# Altium footprint library NXP_60_26022015.PCBLIB: 287 footprints (part 8 of 18)
Each footprint in its own frame and in the unit in brackets; x right, y up, seen from the top. Pads: shape width x height; smd on the part's side, far side on the other; paste and mask are expansions set on the pad; w line width, h text height; cw(c..) or ccw(c..) is an arc to the next point about the centre after c.
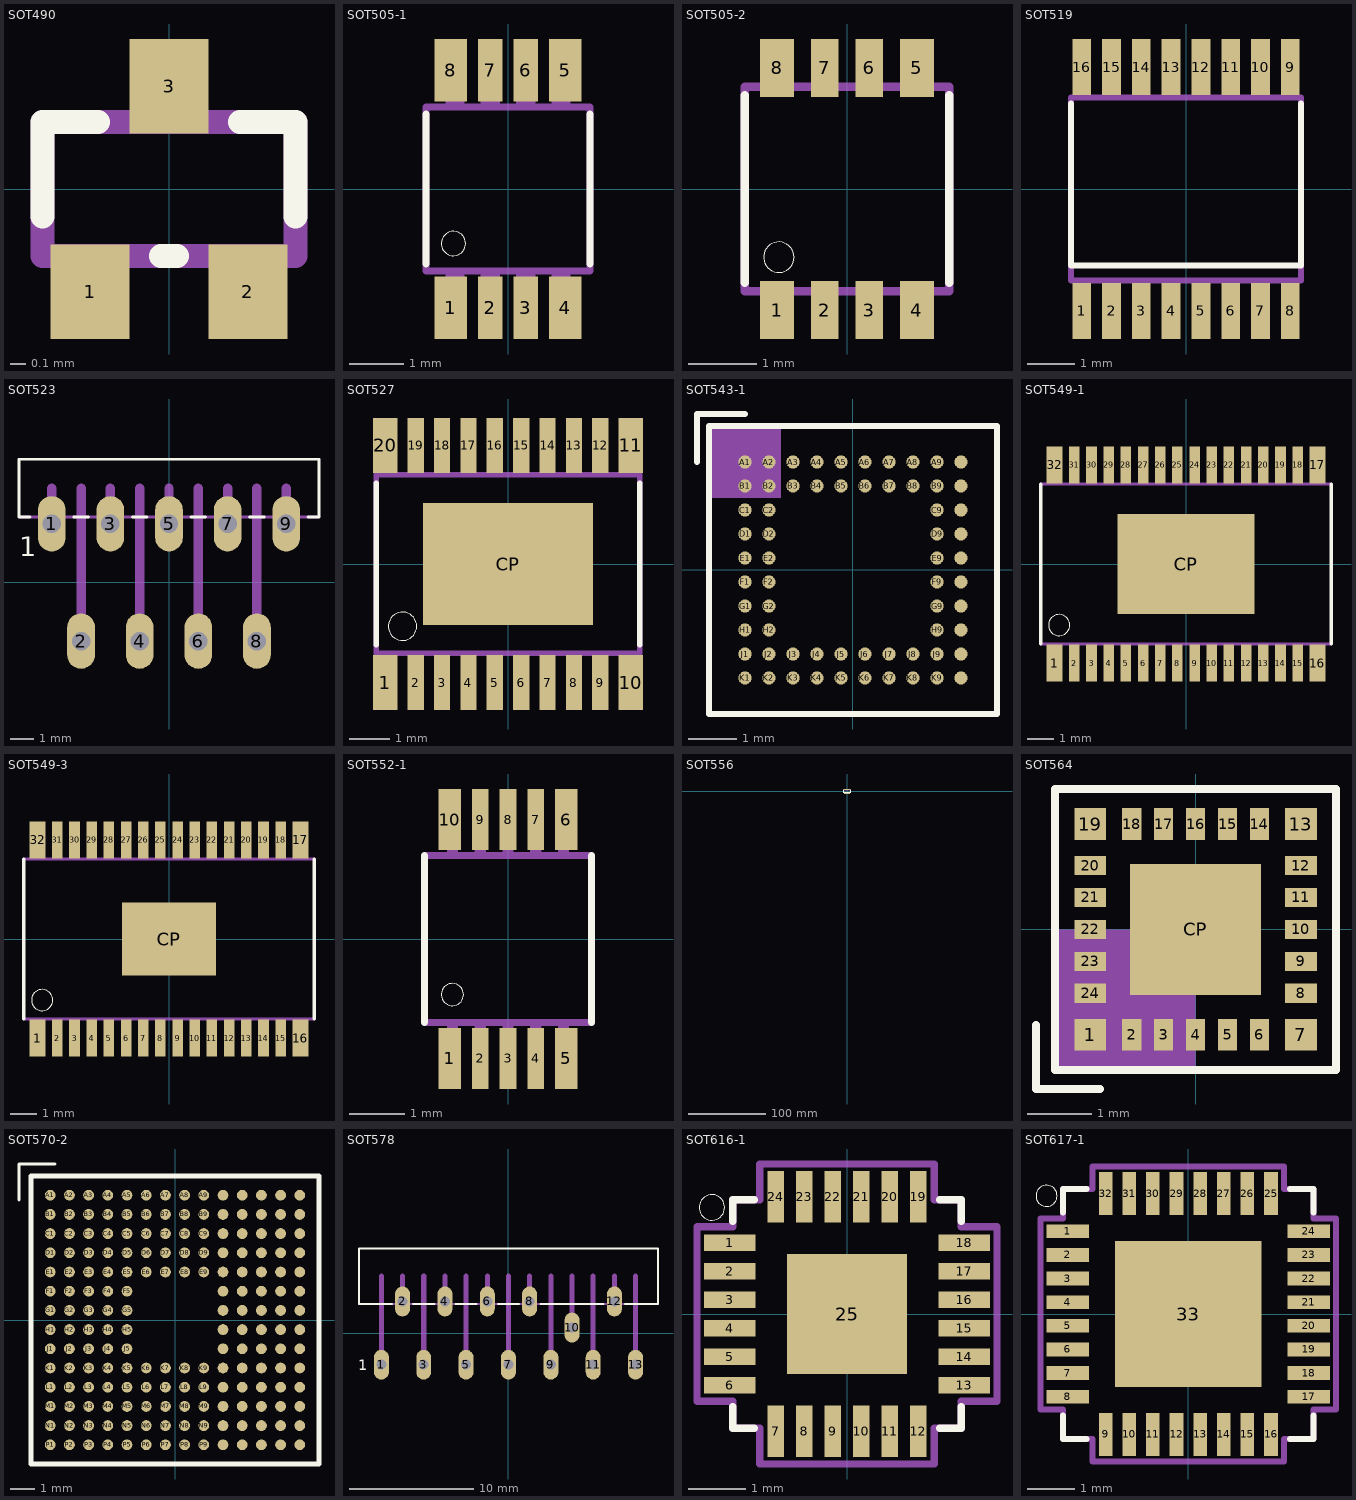
[diagram p7: the footprints below, top view; thin cyan lines are the x and y axes]

## SOT490 [mm]
pads (3):
  rect 0.5x0.6 smd: 1(-0.5,-0.65) 2(0.5,-0.65) 3(0,0.65)
Top Overlay:
  lines w0.152: -0.8,-0.175 -0.8,0.425 -0.45,0.425 ; -0.05,-0.425 0.05,-0.425 ; 0.45,0.425 0.8,0.425 0.8,-0.175
Mechanical 16:
  rectangle: -0.14,0.425 0.14,0.825
  rectangle: -0.64,-0.825 -0.36,-0.425
  rectangle: 0.36,-0.825 0.64,-0.425
  lines w0.152: -0.8,-0.425 0.8,-0.425 0.8,0.425 -0.8,0.425 -0.8,-0.425

## SOT505-1 [mm]
pads (8):
  rect 0.6x1.15 smd: 1(-1.05,-2.175) 4(1.05,-2.175) 5(1.05,2.175) 8(-1.05,2.175)
  rect 0.45x1.15 smd: 2(-0.325,-2.175) 3(0.325,-2.175) 6(0.325,2.175) 7(-0.325,2.175)
Top Overlay:
  circle w0: c-1,-1 r0.224
  lines w0.127: -1.5,-1.375 -1.5,1.375 ; 1.5,-1.375 1.5,1.375
Mechanical 16:
  rectangle: -1.15,1.5 -0.8,2.4
  rectangle: -0.5,1.5 -0.15,2.4
  rectangle: 0.15,1.5 0.5,2.4
  rectangle: 0.8,1.5 1.15,2.4
  rectangle: -1.15,-2.4 -0.8,-1.5
  rectangle: -0.5,-2.4 -0.15,-1.5
  rectangle: 0.15,-2.4 0.5,-1.5
  rectangle: 0.8,-2.4 1.15,-1.5
  lines w0.127: -1.5,-1.5 1.5,-1.5 1.5,1.5 -1.5,1.5 -1.5,-1.5

## SOT505-2 [mm]
pads (8):
  rect 0.5x0.85 smd: 1(-1.025,-1.775) 4(1.025,-1.775) 5(1.025,1.775) 8(-1.025,1.775)
  rect 0.4x0.85 smd: 2(-0.325,-1.775) 3(0.325,-1.775) 6(0.325,1.775) 7(-0.325,1.775)
Top Overlay:
  circle w0: c-1,-1 r0.224
  lines w0.127: -1.5,-1.375 -1.5,1.375 ; 1.5,-1.375 1.5,1.375
Mechanical 16:
  rectangle: -1.15,1.5 -0.8,2
  rectangle: -0.5,1.5 -0.15,2
  rectangle: 0.15,1.5 0.5,2
  rectangle: 0.8,1.5 1.15,2
  rectangle: -1.15,-2 -0.8,-1.5
  rectangle: -0.5,-2 -0.15,-1.5
  rectangle: 0.15,-2 0.5,-1.5
  rectangle: 0.8,-2 1.15,-1.5
  lines w0.127: -1.5,-1.5 1.5,-1.5 1.5,1.5 -1.5,1.5 -1.5,-1.5

## SOT519 [mil]
pads (16):
  rect 15.75x47.24 smd: 1(-87.5,-102.36) 2(-62.5,-102.36) 3(-37.5,-102.36) 4(-12.5,-102.36) 5(12.5,-102.36) 6(37.5,-102.36) 7(62.5,-102.36) 8(87.5,-102.36) 9(87.5,102.36) 10(62.5,102.36) 11(37.5,102.36) 12(12.5,102.36) 13(-12.5,102.36) 14(-37.5,102.36) 15(-62.5,102.36) 16(-87.5,102.36)
Top Overlay:
  lines w5: -96.46,71.85 -96.46,-64.27 96.46,-64.27 96.46,71.85
Mechanical 16:
  rectangle: -93.5,-114.17 -81.69,-74.8
  region: -81.5,114.17 -93.31,114.17 -93.31,74.8 -81.5,74.8
  region: -56.5,114.17 -68.31,114.17 -68.31,74.8 -56.5,74.8
  region: -31.5,114.17 -43.31,114.17 -43.31,74.8 -31.5,74.8
  region: -6.5,114.17 -18.31,114.17 -18.31,74.8 -6.5,74.8
  region: 18.5,114.17 6.69,114.17 6.69,74.8 18.5,74.8
  region: 43.5,114.17 31.69,114.17 31.69,74.8 43.5,74.8
  region: 68.5,114.17 56.69,114.17 56.69,74.8 68.5,74.8
  region: 93.5,114.17 81.69,114.17 81.69,74.8 93.5,74.8
  rectangle: -68.5,-114.17 -56.69,-74.8
  rectangle: -43.5,-114.17 -31.69,-74.8
  rectangle: -18.5,-114.17 -6.69,-74.8
  rectangle: 6.5,-114.17 18.31,-74.8
  rectangle: 31.5,-114.17 43.31,-74.8
  rectangle: 56.5,-114.17 68.31,-74.8
  rectangle: 81.5,-114.17 93.31,-74.8
  lines w5: -96.46,-76.77 96.46,-76.77 96.46,76.77 -96.46,76.77 -96.46,-76.77

## SOT523 [mil]
pads (9):
  oval 47.25x94.5 hole 31.5: 1(-200,100) 2(-150,-100) 3(-100,100) 4(-50,-100) 5(0,100) 6(50,-100) 7(100,100) 8(150,-100) 9(200,100)
Top Overlay:
  lines w5: -237.5,111.81 -255.91,111.81 -255.91,210.24 255.91,210.24 255.91,111.81 237.5,111.81 ; -162.5,111.81 -137.5,111.81 ; -62.5,111.81 -37.5,111.81 ; 37.5,111.81 62.5,111.81 ; 137.5,111.81 162.5,111.81
  text "1" at -255.32,44.69 h33.46
Mechanical 16:
  lines w5: -255.91,111.81 255.91,111.81
  lines w16: -200,100 -200,161.02 ; -150,-100 -150,161.02 ; -100,100 -100,161.02 ; -50,-100 -50,161.02 ; 0,100 0,161.02 ; 50,-100 50,161.02 ; 100,100 100,161.02 ; 150,-100 150,161.02 ; 200,100 200,161.02

## SOT527 [mm]
pads (21):
  rect 0.6x1.35 smd: 1(-3.025,-2.925) 10(3.025,-2.925) 11(3.025,2.925) 20(-3.025,2.925)
  rect 0.4x1.35 smd: 2(-2.275,-2.925) 3(-1.625,-2.925) 4(-0.975,-2.925) 5(-0.325,-2.925) 6(0.325,-2.925) 7(0.975,-2.925) 8(1.625,-2.925) 9(2.275,-2.925) 12(2.275,2.925) 13(1.625,2.925) 14(0.975,2.925) 15(0.325,2.925) 16(-0.325,2.925) 17(-0.975,2.925) 18(-1.625,2.925) 19(-2.275,2.925)
  rect 4.2x3 smd: CP(0,0)
Top Overlay:
  circle w0: c-2.6,-1.535 r0.35
  lines w0.127: -3.25,-2 -3.25,2 ; 3.25,-2 3.25,2
Top Paste:
  rectangle: -1.3,0.325 -0.325,1.3
  rectangle: 0.325,0.325 1.3,1.3
  rectangle: -1.3,-1.3 -0.325,-0.325
  rectangle: 0.325,-1.3 1.3,-0.325
Mechanical 16:
  rectangle: 0.2,2.2 0.45,3.2
  rectangle: -0.45,2.2 -0.2,3.2
  rectangle: -1.1,2.2 -0.85,3.2
  rectangle: -1.75,2.2 -1.5,3.2
  rectangle: -2.4,2.2 -2.15,3.2
  rectangle: -3.05,2.2 -2.8,3.2
  rectangle: 0.85,2.2 1.1,3.2
  rectangle: 1.5,2.2 1.75,3.2
  rectangle: 2.15,2.2 2.4,3.2
  rectangle: 2.8,2.2 3.05,3.2
  rectangle: -3.05,-3.2 -2.8,-2.2
  rectangle: -2.4,-3.2 -2.15,-2.2
  rectangle: -1.75,-3.2 -1.5,-2.2
  rectangle: -1.1,-3.2 -0.85,-2.2
  rectangle: -0.45,-3.2 -0.2,-2.2
  rectangle: 0.2,-3.2 0.45,-2.2
  rectangle: 0.85,-3.2 1.1,-2.2
  rectangle: 1.5,-3.2 1.75,-2.2
  rectangle: 2.15,-3.2 2.4,-2.2
  rectangle: 2.8,-3.2 3.05,-2.2
  lines w0.127: -3.25,-2.2 3.25,-2.2 3.25,2.2 -3.25,2.2 -3.25,-2.2

## SOT543-1 [mm]
pads (64):
  rrect100% 0.275x0.275 smd: A1(-2.25,2.25) A2(-1.75,2.25) A3(-1.25,2.25) A4(-0.75,2.25) A5(-0.25,2.25) A6(0.25,2.25) A7(0.75,2.25) A8(1.25,2.25) A9(1.75,2.25) A10(2.25,2.25) B1(-2.25,1.75) B2(-1.75,1.75) B3(-1.25,1.75) B4(-0.75,1.75) B5(-0.25,1.75) B6(0.25,1.75) B7(0.75,1.75) B8(1.25,1.75) B9(1.75,1.75) B10(2.25,1.75) C1(-2.25,1.25) C2(-1.75,1.25) C9(1.75,1.25) C10(2.25,1.25) D1(-2.25,0.75) D2(-1.75,0.75) D9(1.75,0.75) D10(2.25,0.75) E1(-2.25,0.25) E2(-1.75,0.25) E9(1.75,0.25) E10(2.25,0.25) F1(-2.25,-0.25) F2(-1.75,-0.25) F9(1.75,-0.25) F10(2.25,-0.25) G1(-2.25,-0.75) G2(-1.75,-0.75) G9(1.75,-0.75) G10(2.25,-0.75) H1(-2.25,-1.25) H2(-1.75,-1.25) H9(1.75,-1.25) H10(2.25,-1.25) J1(-2.25,-1.75) J2(-1.75,-1.75) J3(-1.25,-1.75) J4(-0.75,-1.75) J5(-0.25,-1.75) J6(0.25,-1.75) J7(0.75,-1.75) J8(1.25,-1.75) J9(1.75,-1.75) J10(2.25,-1.75) K1(-2.25,-2.25) K2(-1.75,-2.25) K3(-1.25,-2.25) K4(-0.75,-2.25) K5(-0.25,-2.25) K6(0.25,-2.25) K7(0.75,-2.25) K8(1.25,-2.25) K9(1.75,-2.25) K10(2.25,-2.25)
Top Overlay:
  lines w0.127: -3.25,2.25 -3.25,3.25 -2.25,3.25 ; -3,-3 -3,3 3,3 3,-3 -3,-3
Mechanical 16:
  region: -3,2.95 -3,1.5 -1.5,1.5 -1.5,2.95

## SOT549-1 [mm]
pads (33):
  rect 0.6x1.4 smd: 1(-4.975,-3.75) 16(4.975,-3.75) 17(4.975,3.75) 32(-4.975,3.75)
  rect 0.4x1.4 smd: 2(-4.225,-3.75) 3(-3.575,-3.75) 4(-2.925,-3.75) 5(-2.275,-3.75) 6(-1.625,-3.75) 7(-0.975,-3.75) 8(-0.325,-3.75) 9(0.325,-3.75) 10(0.975,-3.75) 11(1.625,-3.75) 12(2.275,-3.75) 13(2.925,-3.75) 14(3.575,-3.75) 15(4.225,-3.75) 18(4.225,3.75) 19(3.575,3.75) 20(2.925,3.75) 21(2.275,3.75) 22(1.625,3.75) 23(0.975,3.75) 24(0.325,3.75) 25(-0.325,3.75) 26(-0.975,3.75) 27(-1.625,3.75) 28(-2.275,3.75) 29(-2.925,3.75) 30(-3.575,3.75) 31(-4.225,3.75)
  rect 5.2x3.8 smd: CP(0,0)
Top Overlay:
  circle w0: c-4.8,-2.31 r0.4
  lines w0.127: -5.5,-3.025 -5.5,3.025 ; 5.5,-3.025 5.5,3.025
Top Paste:
  rectangle: 0.183,-0.4 1.183,0.4
  rectangle: 1.549,-0.4 2.549,0.4
  rectangle: -1.183,-0.4 -0.183,0.4
  rectangle: -2.549,-0.4 -1.549,0.4
  rectangle: 1.549,1.05 2.549,1.85
  rectangle: 0.183,1.05 1.183,1.85
  rectangle: -1.183,1.05 -0.183,1.85
  rectangle: -2.549,1.05 -1.549,1.85
  rectangle: -2.549,-1.85 -1.549,-1.05
  rectangle: -1.183,-1.85 -0.183,-1.05
  rectangle: 0.183,-1.85 1.183,-1.05
  rectangle: 1.549,-1.85 2.549,-1.05
Mechanical 16:
  rectangle: -1.1,3.025 -0.85,4.025
  rectangle: -1.75,3.025 -1.5,4.025
  rectangle: -2.4,3.025 -2.15,4.025
  rectangle: -3.05,3.025 -2.8,4.025
  rectangle: -3.7,3.025 -3.45,4.025
  rectangle: -4.35,3.025 -4.1,4.025
  rectangle: -5,3.025 -4.75,4.025
  rectangle: -0.45,3.025 -0.2,4.025
  rectangle: 0.2,3.025 0.45,4.025
  rectangle: 0.85,3.025 1.1,4.025
  rectangle: 1.5,3.025 1.75,4.025
  rectangle: 2.15,3.025 2.4,4.025
  rectangle: 4.1,3.025 4.35,4.025
  rectangle: 4.75,3.025 5,4.025
  rectangle: -1.1,-4.025 -0.85,-3.025
  rectangle: -1.75,-4.025 -1.5,-3.025
  rectangle: -2.4,-4.025 -2.15,-3.025
  rectangle: -3.05,-4.025 -2.8,-3.025
  rectangle: -3.7,-4.025 -3.45,-3.025
  rectangle: -4.35,-4.025 -4.1,-3.025
  rectangle: -5,-4.025 -4.75,-3.025
  rectangle: -0.45,-4.025 -0.2,-3.025
  rectangle: 0.2,-4.025 0.45,-3.025
  rectangle: 0.85,-4.025 1.1,-3.025
  rectangle: 1.5,-4.025 1.75,-3.025
  rectangle: 2.15,-4.025 2.4,-3.025
  rectangle: 4.1,-4.025 4.35,-3.025
  rectangle: 4.75,-4.025 5,-3.025
  rectangle: 2.8,3.025 3.05,4.025
  rectangle: 3.45,3.025 3.7,4.025
  rectangle: 2.8,-4.025 3.05,-3.025
  rectangle: 3.45,-4.025 3.7,-3.025
  lines w0.127: -5.5,-3.025 5.5,-3.025 ; -5.5,3.025 5.5,3.025

## SOT549-3 [mm]
pads (33):
  rect 0.6x1.4 smd: 1(-4.975,-3.75) 16(4.975,-3.75) 17(4.975,3.75) 32(-4.975,3.75)
  rect 0.4x1.4 smd: 2(-4.225,-3.75) 3(-3.575,-3.75) 4(-2.925,-3.75) 5(-2.275,-3.75) 6(-1.625,-3.75) 7(-0.975,-3.75) 8(-0.325,-3.75) 9(0.325,-3.75) 10(0.975,-3.75) 11(1.625,-3.75) 12(2.275,-3.75) 13(2.925,-3.75) 14(3.575,-3.75) 15(4.225,-3.75) 18(4.225,3.75) 19(3.575,3.75) 20(2.925,3.75) 21(2.275,3.75) 22(1.625,3.75) 23(0.975,3.75) 24(0.325,3.75) 25(-0.325,3.75) 26(-0.975,3.75) 27(-1.625,3.75) 28(-2.275,3.75) 29(-2.925,3.75) 30(-3.575,3.75) 31(-4.225,3.75)
  rect 3.55x2.75 smd: CP(0,0)
Top Overlay:
  circle w0: c-4.8,-2.31 r0.4
  lines w0.127: -5.5,-3.025 -5.5,3.025 ; 5.5,-3.025 5.5,3.025
Top Paste:
  rectangle: 0.163,0.163 0.975,0.975
  rectangle: 0.163,-0.975 0.975,-0.163
  rectangle: -0.975,-0.975 -0.163,-0.163
  rectangle: -0.975,0.163 -0.163,0.975
Mechanical 16:
  rectangle: -1.1,3.025 -0.85,4.025
  rectangle: -1.75,3.025 -1.5,4.025
  rectangle: -2.4,3.025 -2.15,4.025
  rectangle: -3.05,3.025 -2.8,4.025
  rectangle: -3.7,3.025 -3.45,4.025
  rectangle: -4.35,3.025 -4.1,4.025
  rectangle: -5,3.025 -4.75,4.025
  rectangle: -0.45,3.025 -0.2,4.025
  rectangle: 0.2,3.025 0.45,4.025
  rectangle: 0.85,3.025 1.1,4.025
  rectangle: 1.5,3.025 1.75,4.025
  rectangle: 2.15,3.025 2.4,4.025
  rectangle: 4.1,3.025 4.35,4.025
  rectangle: 4.75,3.025 5,4.025
  rectangle: -1.1,-4.025 -0.85,-3.025
  rectangle: -1.75,-4.025 -1.5,-3.025
  rectangle: -2.4,-4.025 -2.15,-3.025
  rectangle: -3.05,-4.025 -2.8,-3.025
  rectangle: -3.7,-4.025 -3.45,-3.025
  rectangle: -4.35,-4.025 -4.1,-3.025
  rectangle: -5,-4.025 -4.75,-3.025
  rectangle: -0.45,-4.025 -0.2,-3.025
  rectangle: 0.2,-4.025 0.45,-3.025
  rectangle: 0.85,-4.025 1.1,-3.025
  rectangle: 1.5,-4.025 1.75,-3.025
  rectangle: 2.15,-4.025 2.4,-3.025
  rectangle: 4.1,-4.025 4.35,-3.025
  rectangle: 4.75,-4.025 5,-3.025
  rectangle: 2.8,3.025 3.05,4.025
  rectangle: 3.45,3.025 3.7,4.025
  rectangle: 2.8,-4.025 3.05,-3.025
  rectangle: 3.45,-4.025 3.7,-3.025
  lines w0.127: -5.5,-3.025 5.5,-3.025 ; -5.5,3.025 5.5,3.025

## SOT552-1 [mm]
pads (10):
  rect 0.4x1.1 smd: 1(-1.05,-2.15) 5(1.05,-2.15) 6(1.05,2.15) 10(-1.05,2.15)
  rect 0.3x1.1 smd: 2(-0.5,-2.15) 3(0,-2.15) 4(0.5,-2.15) 7(0.5,2.15) 8(0,2.15) 9(-0.5,2.15)
Top Overlay:
  circle w0: c-1,-1 r0.2
  lines w0.127: -1.5,-1.5 -1.5,1.5 ; 1.5,-1.5 1.5,1.5
Mechanical 16:
  rectangle: -0.1,1.5 0.1,2.45
  rectangle: -0.6,1.5 -0.4,2.45
  rectangle: -1.1,1.5 -0.9,2.45
  rectangle: 0.4,1.5 0.6,2.45
  rectangle: 0.9,1.5 1.1,2.45
  rectangle: -1.1,-2.45 -0.9,-1.5
  rectangle: -0.6,-2.45 -0.4,-1.5
  rectangle: -0.1,-2.45 0.1,-1.5
  rectangle: 0.4,-2.45 0.6,-1.5
  rectangle: 0.9,-2.45 1.1,-1.5
  lines w0.127: -1.5,-1.5 1.5,-1.5 ; -1.5,1.5 1.5,1.5

## SOT556 [mil]
pads (24):
  rect 15.75x47.24 smd: 1(-137.5,-102.36) 2(-112.5,-102.36) 3(-87.5,-102.36) 4(-62.5,-102.36) 5(-37.5,-102.36) 6(-12.5,-102.36) 7(12.5,-102.36) 8(37.5,-102.36) 9(62.5,-102.36) 10(87.5,-102.36) 11(112.5,-102.36) 12(137.5,-102.36) 13(137.5,102.36) 14(112.5,102.36) 15(87.5,102.36) 16(62.5,102.36) 17(37.5,102.36) 18(12.5,102.36) 19(-12.5,102.36) 20(-37.5,102.36) 21(-62.5,102.36) 22(-87.5,102.36) 23(-112.5,102.36) 24(-137.5,102.36)
Top Overlay:
  lines w5: -171.26,-76.77 -171.26,-64.27 ; -171.26,76.77 -171.26,-64.27 ; 171.26,-76.77 171.26,-64.27 ; 171.26,76.77 171.26,-64.27 ; -171.26,-64.27 cw(c0,-7635.39) 171.26,-64.27
Mechanical 16:
  rectangle: -143.5,-114.17 -131.69,-74.8
  region: -131.5,114.17 -143.31,114.17 -143.31,74.8 -131.5,74.8
  region: -106.5,114.17 -118.31,114.17 -118.31,74.8 -106.5,74.8
  region: -81.5,114.17 -93.31,114.17 -93.31,74.8 -81.5,74.8
  region: -56.5,114.17 -68.31,114.17 -68.31,74.8 -56.5,74.8
  region: -31.5,114.17 -43.31,114.17 -43.31,74.8 -31.5,74.8
  region: -6.5,114.17 -18.31,114.17 -18.31,74.8 -6.5,74.8
  region: 18.5,114.17 6.69,114.17 6.69,74.8 18.5,74.8
  region: 43.5,114.17 31.69,114.17 31.69,74.8 43.5,74.8
  rectangle: -118.5,-114.17 -106.69,-74.8
  rectangle: -93.5,-114.17 -81.69,-74.8
  rectangle: -68.5,-114.17 -56.69,-74.8
  rectangle: -43.5,-114.17 -31.69,-74.8
  rectangle: -18.5,-114.17 -6.69,-74.8
  rectangle: 6.5,-114.17 18.31,-74.8
  rectangle: 31.5,-114.17 43.31,-74.8
  region: 68.5,114.17 56.69,114.17 56.69,74.8 68.5,74.8
  region: 93.5,114.17 81.69,114.17 81.69,74.8 93.5,74.8
  region: 118.5,114.17 106.69,114.17 106.69,74.8 118.5,74.8
  region: 143.5,114.17 131.69,114.17 131.69,74.8 143.5,74.8
  rectangle: 56.5,-114.17 68.31,-74.8
  rectangle: 81.5,-114.17 93.31,-74.8
  rectangle: 106.5,-114.17 118.31,-74.8
  rectangle: 131.5,-114.17 143.31,-74.8
  lines w5: -171.26,-76.77 171.26,-76.77 ; -171.26,76.77 171.26,76.77

## SOT564 [mm]
pads (25):
  rect 0.5x0.5 smd: 1(-1.65,-1.65) 7(1.65,-1.65) 13(1.65,1.65) 19(-1.65,1.65)
  rect 0.3x0.5 smd: 2(-1,-1.65) 3(-0.5,-1.65) 4(0,-1.65) 5(0.5,-1.65) 6(1,-1.65) 14(1,1.65) 15(0.5,1.65) 16(0,1.65) 17(-0.5,1.65) 18(-1,1.65)
  rect 0.5x0.3 smd: 8(1.65,-1) 9(1.65,-0.5) 10(1.65,0) 11(1.65,0.5) 12(1.65,1) 20(-1.65,1) 21(-1.65,0.5) 22(-1.65,0) 23(-1.65,-0.5) 24(-1.65,-1)
  rect 2.05x2.05 smd: CP(0,0)
Top Overlay:
  lines w0.127: -2.5,-1.5 -2.5,-2.5 -1.5,-2.5 ; -2.2,-2.2 2.2,-2.2 2.2,2.2 -2.2,2.2 -2.2,-2.2
Top Paste:
  rectangle: -0.2,-0.2 0.2,0.2
  rectangle: 0.437,-0.2 0.837,0.2
  rectangle: -0.837,-0.2 -0.437,0.2
  rectangle: -0.2,0.437 0.2,0.837
  rectangle: -0.837,0.437 -0.437,0.837
  rectangle: 0.437,0.437 0.837,0.837
  rectangle: -0.2,-0.837 0.2,-0.437
  rectangle: 0.437,-0.837 0.837,-0.437
  rectangle: -0.837,-0.837 -0.437,-0.437
  rectangle: 1.425,-0.15 1.9,0.15
  rectangle: 1.425,0.35 1.9,0.65
  rectangle: 1.425,0.85 1.9,1.15
  rectangle: 1.425,-0.65 1.9,-0.35
  rectangle: 1.425,-1.15 1.9,-0.85
  rectangle: -1.9,-0.15 -1.425,0.15
  rectangle: -1.9,0.35 -1.425,0.65
  rectangle: -1.9,0.85 -1.425,1.15
  rectangle: -1.9,-0.65 -1.425,-0.35
  rectangle: -1.9,-1.15 -1.425,-0.85
  rectangle: -0.15,1.425 0.15,1.9
  rectangle: -0.65,1.425 -0.35,1.9
  rectangle: -1.15,1.425 -0.85,1.9
  rectangle: 0.35,1.425 0.65,1.9
  rectangle: 0.85,1.425 1.15,1.9
  rectangle: -0.15,-1.9 0.15,-1.425
  rectangle: -0.65,-1.9 -0.35,-1.425
  rectangle: -1.15,-1.9 -0.85,-1.425
  rectangle: 0.35,-1.9 0.65,-1.425
  rectangle: 0.85,-1.9 1.15,-1.425
  rectangle: 1.425,1.425 1.9,1.9
  rectangle: -1.9,-1.9 -1.425,-1.425
  rectangle: -1.9,1.425 -1.425,1.9
  rectangle: 1.425,-1.9 1.9,-1.425
Mechanical 16:
  rectangle: -2.2,-2.2 0,0

## SOT570-2 [mm]
pads (180):
  rrect100% 0.45x0.45 smd: A1(-5.2,5.2) A2(-4.4,5.2) A3(-3.6,5.2) A4(-2.8,5.2) A5(-2,5.2) A6(-1.2,5.2) A7(-0.4,5.2) A8(0.4,5.2) A9(1.2,5.2) A10(2,5.2) A11(2.8,5.2) A12(3.6,5.2) A13(4.4,5.2) A14(5.2,5.2) B1(-5.2,4.4) B2(-4.4,4.4) B3(-3.6,4.4) B4(-2.8,4.4) B5(-2,4.4) B6(-1.2,4.4) B7(-0.4,4.4) B8(0.4,4.4) B9(1.2,4.4) B10(2,4.4) B11(2.8,4.4) B12(3.6,4.4) B13(4.4,4.4) B14(5.2,4.4) C1(-5.2,3.6) C2(-4.4,3.6) C3(-3.6,3.6) C4(-2.8,3.6) C5(-2,3.6) C6(-1.2,3.6) C7(-0.4,3.6) C8(0.4,3.6) C9(1.2,3.6) C10(2,3.6) C11(2.8,3.6) C12(3.6,3.6) C13(4.4,3.6) C14(5.2,3.6) D1(-5.2,2.8) D2(-4.4,2.8) D3(-3.6,2.8) D4(-2.8,2.8) D5(-2,2.8) D6(-1.2,2.8) D7(-0.4,2.8) D8(0.4,2.8) D9(1.2,2.8) D10(2,2.8) D11(2.8,2.8) D12(3.6,2.8) D13(4.4,2.8) D14(5.2,2.8) E1(-5.2,2) E2(-4.4,2) E3(-3.6,2) E4(-2.8,2) E5(-2,2) E6(-1.2,2) E7(-0.4,2) E8(0.4,2) E9(1.2,2) E10(2,2) E11(2.8,2) E12(3.6,2) E13(4.4,2) E14(5.2,2) F1(-5.2,1.2) F2(-4.4,1.2) F3(-3.6,1.2) F4(-2.8,1.2) F5(-2,1.2) F10(2,1.2) F11(2.8,1.2) F12(3.6,1.2) F13(4.4,1.2) F14(5.2,1.2) G1(-5.2,0.4) G2(-4.4,0.4) G3(-3.6,0.4) G4(-2.8,0.4) G5(-2,0.4) G10(2,0.4) G11(2.8,0.4) G12(3.6,0.4) G13(4.4,0.4) G14(5.2,0.4) H1(-5.2,-0.4) H2(-4.4,-0.4) H3(-3.6,-0.4) H4(-2.8,-0.4) H5(-2,-0.4) H10(2,-0.4) H11(2.8,-0.4) H12(3.6,-0.4) H13(4.4,-0.4) H14(5.2,-0.4) J1(-5.2,-1.2) J2(-4.4,-1.2) J3(-3.6,-1.2) J4(-2.8,-1.2) J5(-2,-1.2) J10(2,-1.2) J11(2.8,-1.2) J12(3.6,-1.2) J13(4.4,-1.2) J14(5.2,-1.2) K1(-5.2,-2) K2(-4.4,-2) K3(-3.6,-2) K4(-2.8,-2) K5(-2,-2) K6(-1.2,-2) K7(-0.4,-2) K8(0.4,-2) K9(1.2,-2) K10(2,-2) K11(2.8,-2) K12(3.6,-2) K13(4.4,-2) K14(5.2,-2) L1(-5.2,-2.8) L2(-4.4,-2.8) L3(-3.6,-2.8) L4(-2.8,-2.8) L5(-2,-2.8) L6(-1.2,-2.8) L7(-0.4,-2.8) L8(0.4,-2.8) L9(1.2,-2.8) L10(2,-2.8) L11(2.8,-2.8) L12(3.6,-2.8) L13(4.4,-2.8) L14(5.2,-2.8) M1(-5.2,-3.6) M2(-4.4,-3.6) M3(-3.6,-3.6) M4(-2.8,-3.6) M5(-2,-3.6) M6(-1.2,-3.6) M7(-0.4,-3.6) M8(0.4,-3.6) M9(1.2,-3.6) M10(2,-3.6) M11(2.8,-3.6) M12(3.6,-3.6) M13(4.4,-3.6) M14(5.2,-3.6) N1(-5.2,-4.4) N2(-4.4,-4.4) N3(-3.6,-4.4) N4(-2.8,-4.4) N5(-2,-4.4) N6(-1.2,-4.4) N7(-0.4,-4.4) N8(0.4,-4.4) N9(1.2,-4.4) N10(2,-4.4) N11(2.8,-4.4) N12(3.6,-4.4) N13(4.4,-4.4) N14(5.2,-4.4) P1(-5.2,-5.2) P2(-4.4,-5.2) P3(-3.6,-5.2) P4(-2.8,-5.2) P5(-2,-5.2) P6(-1.2,-5.2) P7(-0.4,-5.2) P8(0.4,-5.2) P9(1.2,-5.2) P10(2,-5.2) P11(2.8,-5.2) P12(3.6,-5.2) P13(4.4,-5.2) P14(5.2,-5.2)
Top Overlay:
  lines w0.127: -6.5,5 -6.5,6.5 -5,6.5
  lines w0.203: -6,-6 6,-6 6,6 -6,6 -6,-6

## SOT578 [mil]
pads (13):
  oval 47.25x94.5 hole 31.5: 1(-401.57,-100) 2(-334.65,100) 3(-267.72,-100) 4(-200.79,100) 5(-133.86,-100) 6(-66.93,100) 7(0,-100) 8(66.93,100) 9(133.86,-100) 10(200.79,17.32) 11(267.72,-100) 12(334.65,100) 13(401.57,-100)
Top Overlay:
  lines w6: -368.11,92.13 -472.44,92.13 -472.44,267.72 472.44,267.72 472.44,92.13 368.11,92.13 ; -301.18,92.13 -234.25,92.13 ; -167.32,92.13 -100.39,92.13 ; -33.46,92.13 33.46,92.13 ; 100.39,92.13 301.18,92.13
  text "1" at -475.39,-116.93 h33.46
Mechanical 16:
  lines w6: -472.44,92.13 472.44,92.13
  lines w16: -401.57,-100 -401.57,180.71 ; -334.65,100 -334.65,180.71 ; -267.72,-100 -267.72,180.71 ; -200.79,100 -200.79,180.71 ; -133.86,-100 -133.86,180.71 ; -66.93,100 -66.93,180.71 ; 0,-100 0,180.71 ; 66.93,100 66.93,180.71 ; 133.86,-100 133.86,180.71 ; 200.79,17.32 200.79,180.71 ; 267.72,-100 267.72,180.71 ; 334.65,100 334.65,180.71 ; 401.57,-100 401.57,180.71

## SOT616-1 [mm]
pads (25):
  rect 0.9x0.29 smd: 1(-2.05,1.25) 2(-2.05,0.75) 3(-2.05,0.25) 4(-2.05,-0.25) 5(-2.05,-0.75) 6(-2.05,-1.25) 13(2.05,-1.25) 14(2.05,-0.75) 15(2.05,-0.25) 16(2.05,0.25) 17(2.05,0.75) 18(2.05,1.25)
  rect 0.29x0.9 smd: 7(-1.25,-2.05) 8(-0.75,-2.05) 9(-0.25,-2.05) 10(0.25,-2.05) 11(0.75,-2.05) 12(1.25,-2.05) 19(1.25,2.05) 20(0.75,2.05) 21(0.25,2.05) 22(-0.25,2.05) 23(-0.75,2.05) 24(-1.25,2.05)
  rect 2.1x2.1 smd: 25(0,0)
Top Overlay:
  circle w0: c-2.365,1.865 r0.224
  lines w0.127: -2,-1.625 -2,-2 -1.625,-2 ; -2,1.625 -2,2 -1.625,2 ; 1.625,-2 2,-2 2,-1.625 ; 1.625,2 2,2 2,1.625
Top Paste:
  rectangle: -0.6,0.15 -0.15,0.6
  rectangle: 0.15,0.15 0.6,0.6
  rectangle: 0.15,-0.6 0.6,-0.15
  rectangle: -0.6,-0.6 -0.15,-0.15
Mechanical 16:
  lines w0.127: -2.625,-1.525 -2.625,1.525 -2,1.525 -2,2 -1.525,2 -1.525,2.625 1.525,2.625 1.525,2 2,2 2,1.525 2.625,1.525 2.625,-1.525 2,-1.525 2,-2 1.525,-2 1.525,-2.625 -1.525,-2.625 -1.525,-2 -2,-2 -2,-1.525 -2.625,-1.525

## SOT617-1 [mm]
pads (33):
  rect 0.9x0.29 smd: 1(-2.55,1.75) 2(-2.55,1.25) 3(-2.55,0.75) 4(-2.55,0.25) 5(-2.55,-0.25) 6(-2.55,-0.75) 7(-2.55,-1.25) 8(-2.55,-1.75) 17(2.55,-1.75) 18(2.55,-1.25) 19(2.55,-0.75) 20(2.55,-0.25) 21(2.55,0.25) 22(2.55,0.75) 23(2.55,1.25) 24(2.55,1.75)
  rect 0.29x0.9 smd: 9(-1.75,-2.55) 10(-1.25,-2.55) 11(-0.75,-2.55) 12(-0.25,-2.55) 13(0.25,-2.55) 14(0.75,-2.55) 15(1.25,-2.55) 16(1.75,-2.55) 25(1.75,2.55) 26(1.25,2.55) 27(0.75,2.55) 28(0.25,2.55) 29(-0.25,2.55) 30(-0.75,2.55) 31(-1.25,2.55) 32(-1.75,2.55)
  rect 3.1x3.1 smd: 33(0,0)
Top Overlay:
  circle w0: c-3,2.5 r0.224
  lines w0.127: -2.65,-2.15 -2.65,-2.65 -2.15,-2.65 ; -2.65,2.15 -2.65,2.65 -2.15,2.65 ; 2.15,-2.65 2.65,-2.65 2.65,-2.15 ; 2.15,2.65 2.65,2.65 2.65,2.15
Top Paste:
  rectangle: -0.9,0.2 -0.2,0.9
  rectangle: 0.2,0.2 0.9,0.9
  rectangle: 0.2,-0.9 0.9,-0.2
  rectangle: -0.9,-0.9 -0.2,-0.2
Top Solder:
  rectangle: -1.65,-1.65 1.65,1.65
Mechanical 16:
  lines w0.127: -3.125,-2.025 -3.125,2.025 -2.65,2.025 -2.65,2.65 -2.025,2.65 -2.025,3.125 2.025,3.125 2.025,2.65 2.65,2.65 2.65,2.025 3.125,2.025 3.125,-2.025 2.65,-2.025 2.65,-2.65 2.025,-2.65 2.025,-3.125 -2.025,-3.125 -2.025,-2.65 -2.65,-2.65 -2.65,-2.025 -3.125,-2.025